# Altium footprint library 我的器件.PCBLIB: 450 footprints (part 2 of 29)
Each footprint in its own frame and in the unit in brackets; x right, y up, seen from the top. Pads: shape width x height; smd on the part's side, far side on the other; paste and mask are expansions set on the pad; w line width, h text height; cw(c..) or ccw(c..) is an arc to the next point about the centre after c.
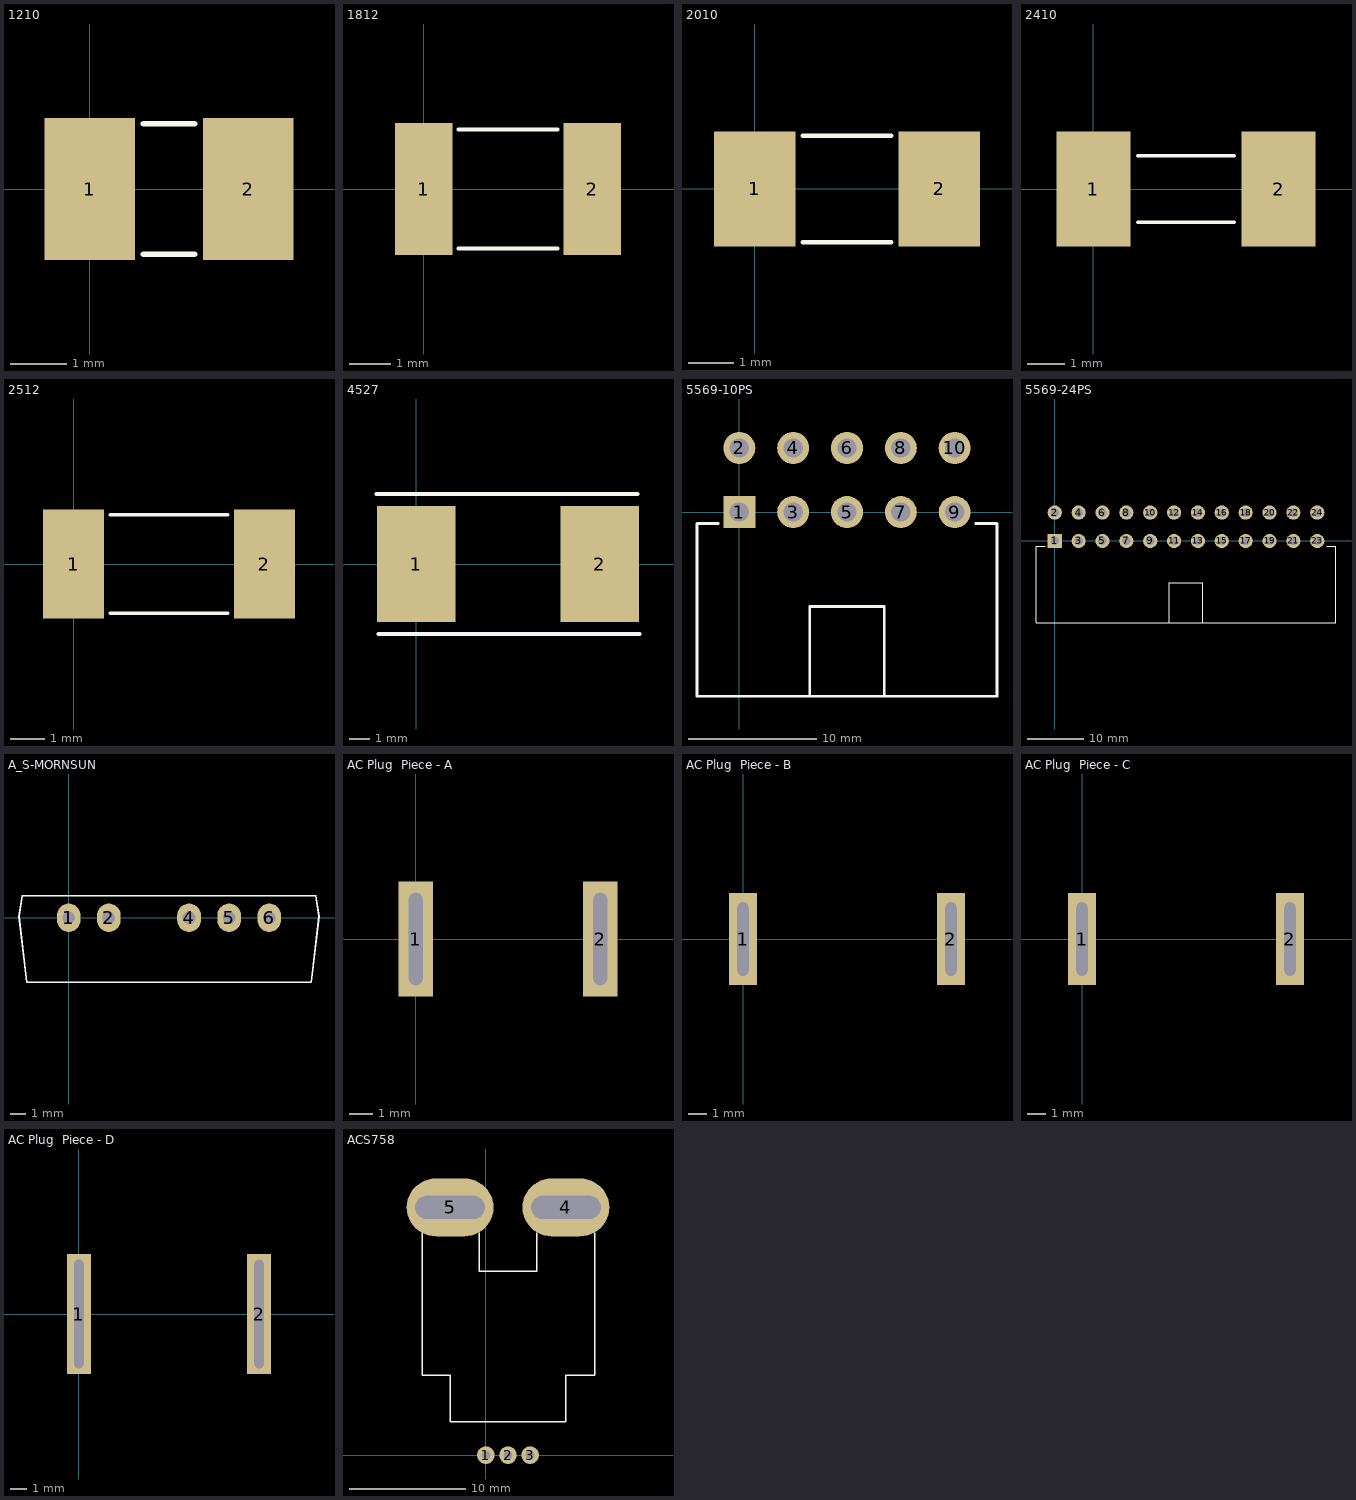
[diagram p1: the footprints below, top view; thin cyan lines are the x and y axes]

## 1210 [mm] "Body 3.0mmX2.54mm"
height 1
pads (2):
  rect 1.6x2.5 smd: 1(0,0) 2(2.8,0)
Top Overlay:
  lines w0.1: 0.95,-1.15 1.85,-1.15 ; 0.95,1.15 1.85,1.15
3D body: height 2, standoff 0.1, extent -0.483,-1.245 0.127,1.245
3D body: height 2, standoff 0.1, extent 2.673,-1.245 3.283,1.245
3D body: height 2, standoff 0.1, extent 0.127,-1.245 2.673,1.245

## 1812 [mm]
pads (2):
  rect 1.4x3.2 smd: 1(0,0) 2(4.1,0)
Top Overlay:
  lines w0.1: 0.85,-1.45 3.25,-1.45 ; 0.85,1.45 3.25,1.45
3D body: height 2, standoff 0.1, extent 0.394,-1.6 3.706,1.6
3D body: height 2, standoff 0.1, extent 3.706,-1.6 4.325,1.6
3D body: height 2, standoff 0.1, extent -0.225,-1.6 0.394,1.6

## 2010 [mm] "Body 5.08mmX2.54mm"
height 1
pads (2):
  rect 1.8x2.54 smd: 1(0,0) 2(4.064,0)
Top Overlay:
  lines w0.1: 1.057,-1.175 3.007,-1.175 ; 1.057,1.175 3.007,1.175
3D body: height 0.4, standoff 0, extent -0.61,-1.295 0.152,1.295
3D body: height 0.4, standoff 0, extent 3.912,-1.295 4.674,1.295
3D body: height 0.4, standoff 0, extent 0.152,-1.295 3.912,1.295
3D body: height 0.41, standoff 0.4, extent 0.152,-1.295 3.912,1.295

## 2410 [mm]
pads (2):
  rect 2x3.1 smd: 1(0,0) 2(5,0)
Top Overlay:
  lines w0.1: 1.2,-0.9 3.8,-0.9 ; 1.2,0.9 3.8,0.9
3D body: height 2.7, standoff 0, extent 4.05,-1.35 5.55,1.35
3D body: height 2.7, standoff 0, extent -0.55,-1.35 0.95,1.35
3D body: height 2.45, standoff 0.25, extent 0.9,-1.1 4.1,1.1

## 2512 [mm] "Body 6.3mmX3.2mm"
height 1
pads (2):
  rect 1.8x3.2 smd: 1(0,0) 2(5.6,0)
Top Overlay:
  lines w0.1: 1.075,-1.45 4.525,-1.45 ; 1.075,1.45 4.525,1.45
3D body: height 0.4, standoff 0, extent -0.508,-1.6 0.229,1.6
3D body: height 0.4, standoff 0, extent 5.371,-1.6 6.108,1.6
3D body: height 0.41, standoff 0.4, extent 0.229,-1.6 5.371,1.6
3D body: height 0.4, standoff 0, extent 0.229,-1.6 5.371,1.6

## 4527 [mm]
pads (2):
  rect 3.94x5.84 smd: 1(0,0) 2(9.2,0)
Top Overlay:
  lines w0.2: -2,3.5 11.1,3.5 ; -1.9,-3.5 11.2,-3.5

## 5569-10PS [mm]
pads (10):
  rect 2.5x2.5 hole 1.5: 1(0,0)
  round 2.5 hole 1.5: 2(0,5) 3(4.2,0) 4(4.2,5) 5(8.4,0) 6(8.4,5) 7(12.6,0) 8(12.6,5) 9(16.8,0) 10(16.8,5)
Top Overlay:
  lines w0.2: -1.651,-0.889 -3.302,-0.889 -3.302,-14.351 20.102,-14.351 20.102,-0.889 18.451,-0.889 ; 5.479,-14.351 5.479,-7.366 11.321,-7.366 11.321,-14.351

## 5569-24PS [mm]
pads (24):
  rect 2.5x2.5 hole 1.5: 1(0,0)
  round 2.5 hole 1.5: 2(0,5) 3(4.2,0) 4(4.2,5) 5(8.4,0) 6(8.4,5) 7(12.6,0) 8(12.6,5) 9(16.8,0) 10(16.8,5) 11(21,0) 12(21,5) 13(25.2,0) 14(25.2,5) 15(29.4,0) 16(29.4,5) 17(33.6,0) 18(33.6,5) 19(37.8,0) 20(37.8,5) 21(42,0) 22(42,5) 23(46.2,0) 24(46.2,5)
Top Overlay:
  lines w0.2: -1.651,-0.889 -3.302,-0.889 -3.302,-14.351 49.502,-14.351 49.502,-0.889 47.851,-0.889 ; 20.193,-14.351 20.193,-7.366 26.035,-7.366 26.035,-14.351

## A_S-MORNSUN [mm]
pads (5):
  oval 1.5x1.8 hole 0.8: 1(0,0) 2(2.54,0) 4(7.62,0) 5(10.16,0) 6(12.7,0)
Top Overlay:
  lines w0.1: -3.15,0.1 -2.65,-4.1 15.35,-4.1 15.85,0.1 15.65,1.4 -2.45,1.4 -2.95,1.4 -3.15,0.1
3D body: height 0.3, standoff -2, extent 12.4,-0.15 13,0.15
3D body: height 0.3, standoff -2, extent 9.86,-0.15 10.46,0.15
3D body: height 0.3, standoff -2, extent 7.32,-0.15 7.92,0.15
3D body: height 0.3, standoff -2, extent 2.24,-0.15 2.84,0.15
3D body: height 0.3, standoff -2, extent -0.3,-0.15 0.3,0.15
3D body: height 0.3, standoff 0, extent 14.35,-4.35 14.95,1.65
3D body: height 9.3, standoff 0.3, extent -3.4,-4.35 16.1,1.65
3D body: height 0.3, standoff 0, extent -2.25,-4.35 -1.65,1.65

## AC Plug  EU [mm]
3D body: height 13.7, standoff 10, extent -11.4,-2 -7.4,2
3D body: height 20.4, standoff 13.7, extent -11.1,-1.696 -7.7,1.697
3D body: height 29, standoff 20.4, extent -11.4,-2 -7.4,2
3D body: height 10, standoff 0, extent -17.5,-6.8 17.5,6.8
3D body: height 29, standoff 20.4, extent 7.4,-2 11.4,2
3D body: height 20.4, standoff 13.7, extent 7.7,-1.697 11.1,1.697
3D body: height 13.7, standoff 10, extent 7.4,-2 11.4,2

## AC Plug  Piece - A [mm]
pads (2):
  rect 1.5x5 hole 0.6 slot 4 at 90 deg: 1(0,0) 2(8,0)
3D body: height 0.3, standoff 0, extent -0.15,-1.9 2.4,1.9
3D body: height 0, standoff -2, extent -0.15,-1.9 0.15,1.9
3D body: height 6, standoff 0, extent 2.1,-1.9 2.4,1.9
3D body: height 6, standoff 0, extent 5.6,-1.9 5.9,1.9
3D body: height 0, standoff -2, extent 7.85,-1.9 8.15,1.9
3D body: height 0.3, standoff 0, extent 5.6,-1.9 8.15,1.9
3D body: height 6, standoff 5.7, extent 2.1,-1.9 5.9,1.9
3D body: height 6, standoff 0, extent 5.6,1.9 5.9,3.9
3D body: height 6, standoff -2, extent 2.1,3.9 3.9,12.1
3D body: height 6, standoff -2, extent 4.1,3.9 5.9,12.1
3D body: height 6, standoff 0, extent 2.1,1.9 2.4,3.9

## AC Plug  Piece - B [mm]
pads (2):
  rect 1.5x5 hole 0.6 slot 4 at 90 deg: 1(0,0) 2(11.3,0)
3D body "小接插件.STEP": height 1.67, standoff -3.15, extent -0.2,-1.75 11.5,10.649

## AC Plug  Piece - C [mm]
pads (2):
  rect 1.5x5 hole 0.6 slot 4 at 90 deg: 1(0,0) 2(11.3,0)
3D body "大接插件.STEP": height 1.69, standoff -3.15, extent -0.225,-1.775 11.475,10.575

## AC Plug  Piece - D [mm]
pads (2):
  rect 1.5x7.5 hole 0.6 slot 6.8 at 90 deg: 1(0,0) 2(11.3,0)
3D body "С(2).STEP": height 4.1, standoff -0.9, extent -0.2,-3.925 11.5,9.398

## AC Plug  USA [mm]
3D body: height 0, standoff -17, extent 2.35,2.85 3.85,9.15
3D body: height 0, standoff -17, extent 15.15,2.85 16.65,9.15
3D body: height 0, standoff -21, extent 7.2,15.7 11.8,20.3
3D body: height 16, standoff 0, extent -1.1,0 20.1,24

## ACS758 [mm]
pads (5):
  round 1.524 hole 0.762: 1(0,0) 2(1.91,0) 3(3.82,0)
  oval 7.5x5 hole 2 slot 6 at 0 deg: 4(6.91,21.4) 5(-3.09,21.4)
Top Overlay:
  lines w0.127: -5.49,19.2 -5.49,6.9 -3.09,6.9 -3.09,2.9 6.91,2.9 6.91,6.9 9.41,6.9 9.41,19.2 ; -0.59,19.2 -0.59,15.9 4.41,15.9 4.41,19.2
3D body: height 4.4, standoff 2.9, extent -5.54,6.9 9.36,22.2
3D body: height 9.3, standoff 0.5, extent -3.09,2.95 6.91,15.95
3D body: height 4.4, standoff 2.9, extent -5.5,20.6 -0.6,22.2
3D body: height 4.4, standoff -2, extent -5.5,20.6 -0.6,22.2
3D body: height 4.4, standoff -2, extent 4.5,20.6 9.4,22.2
3D body: height 4.4, standoff 2.9, extent 4.5,20.6 9.4,22.2
3D body: height 3.7, standoff 3.2, extent -0.3,-0.15 0.3,2.95
3D body: height 3.7, standoff -2, extent -0.3,-0.15 0.3,0.15
3D body: height 3.7, standoff -2, extent 1.61,-0.15 2.21,0.15
3D body: height 3.7, standoff 3.2, extent 1.61,-0.15 2.21,2.95
3D body: height 3.7, standoff -2, extent 3.52,-0.15 4.12,0.15
3D body: height 3.7, standoff 3.2, extent 3.52,-0.15 4.12,2.95
3D body: height 9.31, standoff 0, extent 0.416,7.3 3.404,10.294